# Altium footprint library discrete.PcbLib: 79 footprints (part 1 of 5)
Each footprint in its own frame and in the unit in brackets; x right, y up, seen from the top. Pads: shape width x height; smd on the part's side, far side on the other; paste and mask are expansions set on the pad; w line width, h text height; cw(c..) or ccw(c..) is an arc to the next point about the centre after c.
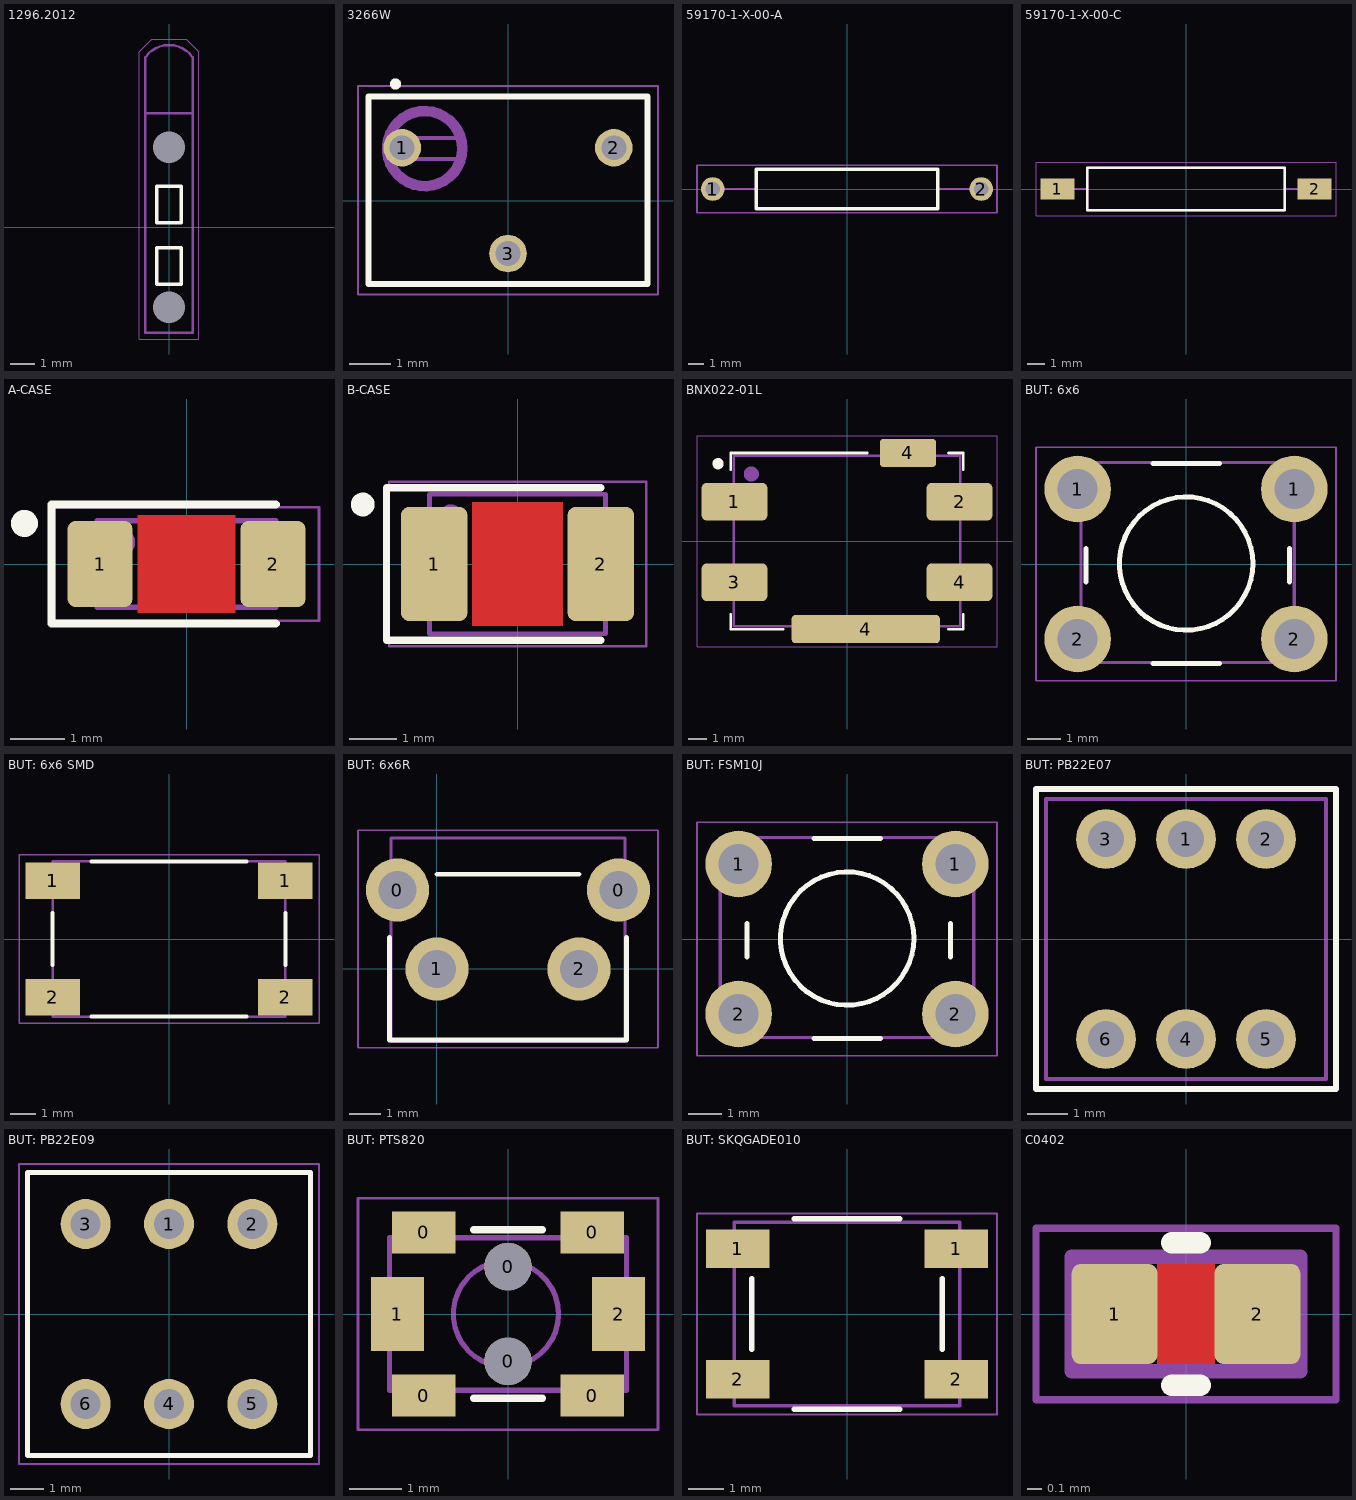
[diagram p0: the footprints below, top view; thin cyan lines are the x and y axes]

## 1296.2012 [mm] "Light Guide"
pads (2):
  round 0 hole 1.3: 0(0,-3.3) 0(0,3.3)
Top Overlay:
  lines w0.15: -0.5,-2.35 0.5,-2.35 0.5,-0.85 -0.5,-0.85 -0.5,-2.35 ; -0.5,0.19 0.5,0.19 0.5,1.69 -0.5,1.69 -0.5,0.19
Top Assy:
  lines w0.1: -0.975,4.7 0.975,4.7 ; -0.975,-4.35 0.975,-4.35 0.975,7 ccw(c0,6.299) -0.975,7 -0.975,-4.35
Top Cortyard:
  lines w0.05: -1.225,-4.6 1.225,-4.6 1.225,7.225 0.7,7.75 -0.7,7.75 -1.225,7.225 -1.225,-4.6

## 3266W [mm]
pads (3):
  round 0.9 hole 0.6: 1(-2.54,1.27) 2(2.54,1.27) 3(0,-1.27)
Top Overlay:
  circle w0.254: c-2.7,2.8 r0.01
  lines w0.15: -3.35,-2 3.35,-2 3.35,2.5 -3.35,2.5 -3.35,-2
Top Assy:
  circle w0.254: c-2,1.25 r0.901
  lines w0.1: -2.75,1 -1.146,0.996 ; -2.75,1.5 -1.146,1.504 ; -3.35,-2 3.35,-2 3.35,2.5 -3.35,2.5 -3.35,-2
  text ".Designator" at -2.225,-0.458 h1.25
Top Cortyard:
  lines w0.05: -3.6,-2.25 3.6,-2.25 3.6,2.75 -3.6,2.75 -3.6,-2.25
3D body: height 7.24, standoff 0, extent -3.35,-2 3.35,2.5

## 59170-1-X-00-A [mm]
pads (2):
  round 1.5 hole 0.9: 1(-8.5,0) 2(8.5,0)
Top Overlay:
  lines w0.2: -5.75,-1.25 -5.75,1.25 5.75,1.25 5.75,-1.25 -5.75,-1.25
Top Assy:
  lines w0.1: -8.5,0 -5.75,0 ; 5.75,0 8.5,0 ; -5.75,-1.25 -5.75,1.25 5.75,1.25 5.75,-1.25 -5.75,-1.25
  text ".Designator" at -1.9,-0.417 h1
Top Cortyard:
  lines w0.1: -9.5,-1.5 -9.5,1.5 9.5,1.5 9.5,-1.5 -9.5,-1.5
3D body "GERKON.STEP": height 3.45, standoff -8.5, extent -8.715,-1.45 8.715,1.45

## 59170-1-X-00-C [mm]
pads (2):
  rect 2x1.2 smd: 1(-7.5,0) 2(7.5,0)
Top Overlay:
  lines w0.15: -5.75,-1.25 -5.75,1.25 5.75,1.25 5.75,-1.25 -5.75,-1.25
Top Assy:
  lines w0.1: -7.5,0 -5.75,0 ; 5.75,0 7.5,0 ; -5.75,-1.25 -5.75,1.25 5.75,1.25 5.75,-1.25 -5.75,-1.25
  text ".Designator" at -2.425,-0.417 h1
Top Cortyard:
  lines w0.05: -8.75,-1.55 -8.75,1.55 8.75,1.55 8.75,-1.55 -8.75,-1.55

## A-CASE [mm]
pads (2):
  rrect25% 1.2x1.6 smd: 1(-1.6,0) 2(1.6,0)
Top Layer:
  pour cut-out: -0.9,-0.9 0.9,-0.9 0.9,0.9 -0.9,0.9
Top Overlay:
  circle w0.3: c-3,0.75 r0.1
  lines w0.15: 1.65,-1.1 -2.5,-1.1 -2.5,1.1 1.65,1.1
Top Assy:
  circle w0.3: c-1.2,0.4 r0.1
  lines w0.1: -1.651,-0.8 1.651,-0.8 1.651,0.8 -1.651,0.8 -1.651,-0.8
  text ".Designator" at -0.825,-0.183 h0.5
Top Cortyard:
  lines w0.05: -2.45,-1.05 2.45,-1.05 2.45,1.05 -2.45,1.05 -2.45,-1.05
3D body "User Library-AVX_ACASE.STEP": height 1.71, standoff 0, extent -1.7,-0.84 1.7,0.84

## B-CASE [mm]
pads (2):
  rrect25% 1.4x2.4 smd: 1(-1.75,0) 2(1.75,0)
Top Layer:
  pour cut-out: -0.95,-1.3 0.95,-1.3 0.95,1.3 -0.95,1.3
Top Overlay:
  circle w0.3: c-3.25,1.25 r0.1
  lines w0.15: 1.75,-1.6 -2.75,-1.6 -2.75,1.6 1.75,1.6
Top Assy:
  circle w0.3: c-1.4,1 r0.1
  lines w0.1: -1.85,-1.465 1.85,-1.465 1.85,1.465 -1.85,1.465 -1.85,-1.465
  text ".Designator" at -0.825,-0.233 h0.5
Top Cortyard:
  lines w0.05: -2.7,-1.725 2.7,-1.725 2.7,1.725 -2.7,1.725 -2.7,-1.725
3D body "User Library-AVX_BCASE.STEP": height 2.03, standoff 0, extent -1.85,-1.465 1.85,1.465

## BNX022-01L [mm]
pads (6):
  rrect25% 3.5x2 smd: 1(-6,2.1) 2(6,2.1) 3(-6,-2.2) 4(6,-2.2)
  rrect25% 7.9x1.5 smd: 4(1,-4.7)
  rrect25% 3x1.5 smd: 4(3.25,4.7)
Top Overlay:
  circle w0.4: c-6.875,4.125 r0.1
  lines w0.15: -6.2,-3.92 -6.2,-4.7 -3.42,-4.7 ; -6.2,3.82 -6.2,4.7 1.08,4.7 ; 5.42,-4.7 6.2,-4.7 6.2,-3.92 ; 5.42,4.7 6.2,4.7 6.2,3.82
Top Assy:
  circle w0.4: c-5.1,3.575 r0.2
  lines w0.127: -6.05,-4.55 -6.05,4.55 6.05,4.55 6.05,-4.55 -6.05,-4.55
  text ".Designator" at 0,0 h0.5
Top Cortyard:
  lines w0.05: -8,-5.625 -8,5.625 8,5.625 8,-5.625 -8,-5.625
3D body "step_temp.STEP": height 3.3, standoff 0, extent -6.05,-4.55 6.05,4.55

## BUT: 6x6 [mm] "Leaded Tactile Button 6x6"
height 5
pads (4):
  round 2 hole 1.2: 1(-3.25,2.25) 1(3.25,2.25) 2(-3.25,-2.25) 2(3.25,-2.25)
Top Overlay:
  circle w0.15: c0.004,0.012 r2
  lines w0.15: -2.996,-0.544 -2.996,0.472 ; -0.996,-2.988 1.004,-2.988 ; -0.996,3.012 1.004,3.012 ; 3.1,-0.544 3.1,0.472
Top Assy:
  lines w0.1: -3.148,-2.957 3.252,-2.957 3.252,3.043 -3.148,3.043 -3.148,-2.957
  text ".Designator" at -1.273,-0.506 h1
Top Cortyard:
  lines w0.05: -4.5,-3.5 -4.5,3.5 4.5,3.5 4.5,-3.5 -4.5,-3.5
3D body "кнопка_тактовая_6х6х1.STEP": height 4.5, standoff -0.9, extent -3.148,-2.957 3.252,3.043

## BUT: 6x6 SMD [mm] "Leaded Tactile Button 6x6"
height 9
pads (4):
  rect 2.1x1.4 smd: 1(-4.5,2.25) 1(4.5,2.25) 2(-4.5,-2.25) 2(4.5,-2.25)
Top Overlay:
  lines w0.15: -4.5,-1 -4.5,1 ; -3,-3 3,-3 ; -3,3 3,3 ; 4.5,-1 4.5,1
Top Assy:
  lines w0.1: -4.5,-3 4.5,-3 4.5,3 -4.5,3 -4.5,-3
  text ".Designator" at -2.25,-0.709 h2
Top Cortyard:
  lines w0.05: -5.8,-3.25 -5.8,3.25 5.8,3.25 5.8,-3.25 -5.8,-3.25
3D body "User Library-PTS645SL43SMTR92-LFS.STEP": height 4.3, standoff 0, extent -4.5,-3 4.5,3

## BUT: 6x6R [mm]
height 7.4
pads (4):
  round 2 hole 1.2: 0(-1.25,2.5) 0(5.75,2.5) 1(0,0) 2(4.5,0)
Top Overlay:
  lines w0.15: -1.5,1 -1.5,-2.25 6,-2.25 6,1 ; 0,3 4.5,3
Top Assy:
  lines w0.1: -1.45,-2.3 -1.45,4.15 5.95,4.15 5.95,-2.3 -1.45,-2.3
  text ".Designator" at 0.552,0.544 h1
Top Cortyard:
  lines w0.05: -2.5,-2.5 -2.5,4.4 7,4.4 7,-2.5 -2.5,-2.5
3D body "User Library-SWITCH, TACTILE, RIGHT ANGLE, 12VDC, 50MA, 6_85MM ACTUATOR, WEALTH METAL TC-0244Z-1.STEP": height 7, standoff -4, extent -1.45,-6.85 5.95,4.15

## BUT: FSM10J [mm] "Leaded Tactile Button 6x6"
height 5
pads (4):
  round 2 hole 1.2: 1(-3.25,2.25) 1(3.25,2.25) 2(-3.25,-2.25) 2(3.25,-2.25)
Top Overlay:
  circle w0.15: c0.004,0.012 r2
  lines w0.15: -2.996,-0.544 -2.996,0.472 ; -0.996,-2.988 1.004,-2.988 ; -0.996,3.012 1.004,3.012 ; 3.1,-0.544 3.1,0.472
Top Assy:
  lines w0.1: -3.8,-2.957 3.8,-2.957 3.8,3.043 -3.8,3.043 -3.8,-2.957
  text ".Designator" at -1.325,-0.367 h1
Top Cortyard:
  lines w0.05: -4.5,-3.5 -4.5,3.5 4.5,3.5 4.5,-3.5 -4.5,-3.5
3D body "FSM10J.STEP": height 7.2, standoff -3.53, extent -3.801,-2.957 3.801,3.043

## BUT: PB22E07 [mm] "DPDT, 7x7"
height 12.3
pads (6):
  round 1.5 hole 0.9: 1(0,2.5) 2(2,2.5) 3(-2,2.5) 4(0,-2.5) 5(2,-2.5) 6(-2,-2.5)
Top Overlay:
  lines w0.15: -3.75,-3.75 3.75,-3.75 3.75,3.75 -3.75,3.75 -3.75,-3.75
Top Assy:
  lines w0.1: -3.5,-3.5 3.5,-3.5 3.5,3.5 -3.5,3.5 -3.5,-3.5
  text ".Designator" at -1.58,-0.383 h1
Top Cortyard:
  lines w0.05: -3.75,-3.75 3.75,-3.75 3.75,3.75 -3.75,3.75 -3.75,-3.75
3D body "PB22E07.STEP": height 12.6, standoff -2, extent -3.5,-3.5 3.5,3.5

## BUT: PB22E09 [mm] "DPDT, 8.5x8.5x14"
height 14
pads (6):
  round 1.5 hole 0.9: 1(0,2.7) 2(2.5,2.7) 3(-2.5,2.7) 4(0,-2.7) 5(2.5,-2.7) 6(-2.5,-2.7)
Top Overlay:
  lines w0.15: -4.25,-4.25 4.25,-4.25 4.25,4.25 -4.25,4.25 -4.25,-4.25
Top Assy:
  lines w0.1: -4.25,-4.25 4.25,-4.25 4.25,4.25 -4.25,4.25 -4.25,-4.25
Top Cortyard:
  lines w0.05: -4.5,-4.5 -4.5,4.5 4.5,4.5 4.5,-4.5 -4.5,-4.5
3D body "PB22E09.STEP": height 14, standoff -2, extent -4.25,-4.25 4.25,4.25

## BUT: PTS820 [mm]
pads (8):
  rect 1.2x0.8 smd: 0(-1.6,-1.55) 0(-1.6,1.55) 0(1.6,-1.55) 0(1.6,1.55)
  round 0.9 hole 0.9 unplated: 0(0,-0.9) 0(0,0.9)
  rect 1x1.4 smd: 1(-2.1,0) 2(2.1,0)
Top Overlay:
  lines w0.15: -0.65,-1.6 0.65,-1.6 ; -0.65,1.6 0.65,1.6
Top Assy:
  circle w0.1: c-0.04,0 r1
  lines w0.1: -2.25,-1.45 -2.25,1.45 2.25,1.45 2.25,-1.45 -2.25,-1.45
  text ".Designator" at -1.4,-0.642 h1
Top Cortyard:
  lines w0.05: -2.85,-2.2 2.85,-2.2 2.85,2.2 -2.85,2.2 -2.85,-2.2
3D body "PTS820J20KSMTRLFS.stp": height 2.05, standoff 0.05, extent -2.25,-1.45 2.25,1.45

## BUT: SKQGADE010 [mm]
pads (4):
  rect 1.8x1.1 smd: 1(-3.1,1.85) 1(3.1,1.85) 2(-3.1,-1.85) 2(3.1,-1.85)
Top Overlay:
  lines w0.15: -2.7,-1 -2.7,1 ; -1.5,-2.7 1.5,-2.7 ; -1.5,2.7 1.5,2.7 ; 2.7,-1 2.7,1
Top Assy:
  lines w0.1: -3.2,-2.6 -3.2,2.6 3.2,2.6 3.2,-2.6 -3.2,-2.6
  text ".Designator" at -1.45,-0.367 h1
Top Cortyard:
  lines w0.05: -4.25,-2.85 -4.25,2.85 4.25,2.85 4.25,-2.85 -4.25,-2.85
3D body "User Library-4x4_SMD_Switch.STEP": height 1.45, standoff -0.05, extent -3.2,-2.6 3.2,2.6

## C0402 [mm]
pads (2):
  rrect20% 0.6x0.7 smd: 1(-0.5,0) 2(0.5,0)
Top Layer:
  pour cut-out: 0.2,-0.35 0.2,0.35 -0.2,0.35 -0.2,-0.35
Top Overlay:
  lines w0.15: -0.1,-0.5 0.1,-0.5 ; -0.1,0.5 0.1,0.5
Top Assy:
  lines w0.1: -0.8,-0.4 -0.8,0.4 0.8,0.4 0.8,-0.4 -0.8,-0.4
  text ".Designator" at -0.626,-0.246 h0.5
Top Cortyard:
  lines w0.05: -1.05,-0.6 1.05,-0.6 1.05,0.6 -1.05,0.6 -1.05,-0.6